# Altium footprint library Package_SO.PcbLib: 333 footprints (part 18 of 21)
Each footprint in its own frame and in the unit in brackets; x right, y up, seen from the top. Pads: shape width x height; smd on the part's side, far side on the other; paste and mask are expansions set on the pad; w line width, h text height; cw(c..) or ccw(c..) is an arc to the next point about the centre after c.
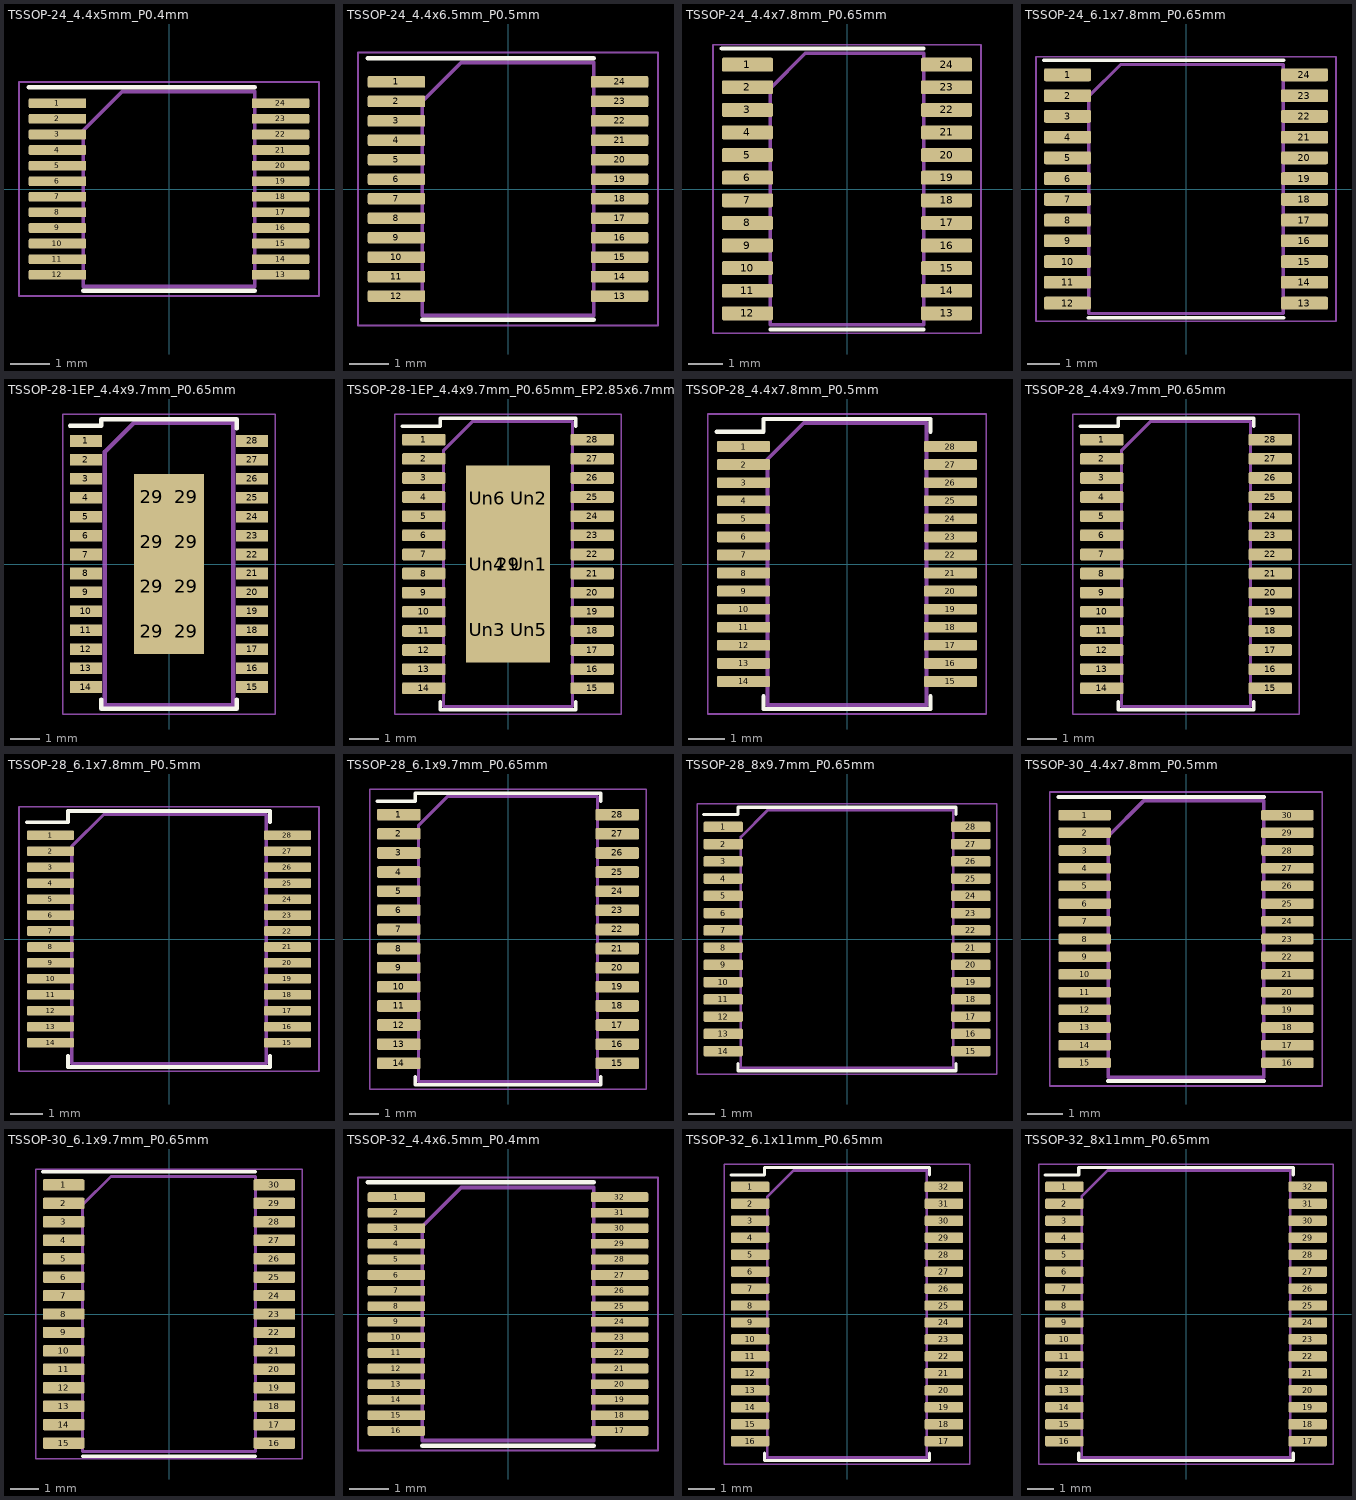
[diagram p17: the footprints below, top view; thin cyan lines are the x and y axes]

## TSSOP-24_4.4x5mm_P0.4mm [mm]
pads (24):
  rrect25% 1.475x0.25 smd: 1(-2.863,2.2) 2(-2.863,1.8) 3(-2.863,1.4) 4(-2.863,1) 5(-2.863,0.6) 6(-2.863,0.2) 7(-2.863,-0.2) 8(-2.863,-0.6) 9(-2.863,-1) 10(-2.863,-1.4) 11(-2.863,-1.8) 12(-2.863,-2.2) 13(2.863,-2.2) 14(2.863,-1.8) 15(2.863,-1.4) 16(2.863,-1) 17(2.863,-0.6) 18(2.863,-0.2) 19(2.863,0.2) 20(2.863,0.6) 21(2.863,1) 22(2.863,1.4) 23(2.863,1.8) 24(2.863,2.2)
F.SilkS:
  lines w0.12: -3.6,2.61 0,2.61 2.2,2.61 ; -2.2,-2.61 0,-2.61 2.2,-2.61
F.CrtYd:
  lines w0.05: -3.85,-2.75 -3.85,2.75 3.85,2.75 3.85,-2.75 -3.85,-2.75
F.Fab:
  lines w0.1: -2.2,-2.5 2.2,-2.5 2.2,2.5 -1.2,2.5 -2.2,1.5 -2.2,-2.5
  text "'.Designator'" at -4.047,-0.84 h1

## TSSOP-24_4.4x6.5mm_P0.5mm [mm]
pads (24):
  rrect25% 1.475x0.3 smd: 1(-2.863,2.75) 2(-2.863,2.25) 3(-2.863,1.75) 4(-2.863,1.25) 5(-2.863,0.75) 6(-2.863,0.25) 7(-2.863,-0.25) 8(-2.863,-0.75) 9(-2.863,-1.25) 10(-2.863,-1.75) 11(-2.863,-2.25) 12(-2.863,-2.75) 13(2.863,-2.75) 14(2.863,-2.25) 15(2.863,-1.75) 16(2.863,-1.25) 17(2.863,-0.75) 18(2.863,-0.25) 19(2.863,0.25) 20(2.863,0.75) 21(2.863,1.25) 22(2.863,1.75) 23(2.863,2.25) 24(2.863,2.75)
F.SilkS:
  lines w0.12: -3.6,3.36 0,3.36 2.2,3.36 ; -2.2,-3.36 0,-3.36 2.2,-3.36
F.CrtYd:
  lines w0.05: -3.85,-3.5 3.85,-3.5 3.85,3.5 -3.85,3.5 -3.85,-3.5
F.Fab:
  lines w0.1: -2.2,-3.25 2.2,-3.25 2.2,3.25 -1.2,3.25 -2.2,2.25 -2.2,-3.25
  text "'.Designator'" at -4.047,-0.84 h1

## TSSOP-24_4.4x7.8mm_P0.65mm [mm]
pads (24):
  rrect25% 1.475x0.4 smd: 1(-2.863,3.575) 2(-2.863,2.925) 3(-2.863,2.275) 4(-2.863,1.625) 5(-2.863,0.975) 6(-2.863,0.325) 7(-2.863,-0.325) 8(-2.863,-0.975) 9(-2.863,-1.625) 10(-2.863,-2.275) 11(-2.863,-2.925) 12(-2.863,-3.575) 13(2.863,-3.575) 14(2.863,-2.925) 15(2.863,-2.275) 16(2.863,-1.625) 17(2.863,-0.975) 18(2.863,-0.325) 19(2.863,0.325) 20(2.863,0.975) 21(2.863,1.625) 22(2.863,2.275) 23(2.863,2.925) 24(2.863,3.575)
F.SilkS:
  lines w0.12: -3.6,4.035 0,4.035 2.2,4.035 ; -2.2,-4.035 0,-4.035 2.2,-4.035
F.CrtYd:
  lines w0.05: -3.85,-4.15 3.85,-4.15 3.85,4.15 -3.85,4.15 -3.85,-4.15
F.Fab:
  lines w0.1: -2.2,-3.9 -2.2,2.9 -1.2,3.9 2.2,3.9 2.2,-3.9 -2.2,-3.9
  text "'.Designator'" at -4.047,-0.84 h1

## TSSOP-24_6.1x7.8mm_P0.65mm [mm]
pads (24):
  rrect25% 1.475x0.4 smd: 1(-3.712,3.575) 2(-3.712,2.925) 3(-3.712,2.275) 4(-3.712,1.625) 5(-3.712,0.975) 6(-3.712,0.325) 7(-3.712,-0.325) 8(-3.712,-0.975) 9(-3.712,-1.625) 10(-3.712,-2.275) 11(-3.712,-2.925) 12(-3.712,-3.575) 13(3.712,-3.575) 14(3.712,-2.925) 15(3.712,-2.275) 16(3.712,-1.625) 17(3.712,-0.975) 18(3.712,-0.325) 19(3.712,0.325) 20(3.712,0.975) 21(3.712,1.625) 22(3.712,2.275) 23(3.712,2.925) 24(3.712,3.575)
F.SilkS:
  lines w0.12: -4.45,4.035 0,4.035 3.05,4.035 ; -3.05,-4.035 0,-4.035 3.05,-4.035
F.CrtYd:
  lines w0.05: -4.7,-4.15 -4.7,4.15 4.7,4.15 4.7,-4.15 -4.7,-4.15
F.Fab:
  lines w0.1: -3.05,-3.9 3.05,-3.9 3.05,3.9 -2.05,3.9 -3.05,2.9 -3.05,-3.9
  text "'.Designator'" at -4.047,-0.84 h1

## TSSOP-28-1EP_4.4x9.7mm_P0.65mm [mm]
pads (36):
  rect 1.1x0.4 smd: 1(-2.85,4.225) 2(-2.85,3.575) 3(-2.85,2.925) 4(-2.85,2.275) 5(-2.85,1.625) 6(-2.85,0.975) 7(-2.85,0.325) 8(-2.85,-0.325) 9(-2.85,-0.975) 10(-2.85,-1.625) 11(-2.85,-2.275) 12(-2.85,-2.925) 13(-2.85,-3.575) 14(-2.85,-4.225) 15(2.85,-4.225) 16(2.85,-3.575) 17(2.85,-2.925) 18(2.85,-2.275) 19(2.85,-1.625) 20(2.85,-0.975) 21(2.85,-0.325) 22(2.85,0.325) 23(2.85,0.975) 24(2.85,1.625) 25(2.85,2.275) 26(2.85,2.925) 27(2.85,3.575) 28(2.85,4.225)
  rect 1.2x1.542 smd: 29(-0.6,-2.314) 29(-0.6,-0.771) 29(-0.6,0.771) 29(-0.6,2.314) 29(0.6,-2.314) 29(0.6,-0.771) 29(0.6,0.771) 29(0.6,2.314)
F.SilkS:
  lines w0.15: -3.4,4.75 -2.325,4.75 -2.325,4.975 2.325,4.975 2.325,4.65 ; -2.325,-4.65 -2.325,-4.975 2.325,-4.975 2.325,-4.65
F.CrtYd:
  lines w0.05: -3.65,-5.15 -3.65,5.15 3.65,5.15 3.65,-5.15 -3.65,-5.15
F.Fab:
  lines w0.15: -2.2,-4.85 -2.2,3.85 -1.2,4.85 2.2,4.85 2.2,-4.85 -2.2,-4.85
  text "'.Designator'" at -3.267,-0.702 h0.8

## TSSOP-28-1EP_4.4x9.7mm_P0.65mm_EP2.85x6.7mm [mm]
pads (35):
  rrect25% 1.475x0.4 smd: 1(-2.863,4.225) 2(-2.863,3.575) 3(-2.863,2.925) 4(-2.863,2.275) 5(-2.863,1.625) 6(-2.863,0.975) 7(-2.863,0.325) 8(-2.863,-0.325) 9(-2.863,-0.975) 10(-2.863,-1.625) 11(-2.863,-2.275) 12(-2.863,-2.925) 13(-2.863,-3.575) 14(-2.863,-4.225) 15(2.863,-4.225) 16(2.863,-3.575) 17(2.863,-2.925) 18(2.863,-2.275) 19(2.863,-1.625) 20(2.863,-0.975) 21(2.863,-0.325) 22(2.863,0.325) 23(2.863,0.975) 24(2.863,1.625) 25(2.863,2.275) 26(2.863,2.925) 27(2.863,3.575) 28(2.863,4.225)
  rect 2.85x6.7 smd: 29(0,0)
  rrect22% 1.15x1.8 on Top Paste: Un1(0.71,0) Un2(0.71,2.23) Un3(-0.71,-2.23) Un4(-0.71,0) Un5(0.71,-2.23) Un6(-0.71,2.23)
F.SilkS:
  lines w0.12: -3.6,4.685 -2.31,4.685 -2.31,4.96 0,4.96 2.31,4.96 2.31,4.685 ; -2.31,-4.685 -2.31,-4.96 0,-4.96 2.31,-4.96 2.31,-4.685
F.CrtYd:
  lines w0.05: -3.85,-5.1 3.85,-5.1 3.85,5.1 -3.85,5.1 -3.85,-5.1
F.Fab:
  lines w0.1: -2.2,-4.85 -2.2,3.85 -1.2,4.85 2.2,4.85 2.2,-4.85 -2.2,-4.85
  text "'.Designator'" at -4.047,-0.84 h1

## TSSOP-28_4.4x7.8mm_P0.5mm [mm]
pads (28):
  rrect25% 1.475x0.3 smd: 1(-2.863,3.25) 2(-2.863,2.75) 3(-2.863,2.25) 4(-2.863,1.75) 5(-2.863,1.25) 6(-2.863,0.75) 7(-2.863,0.25) 8(-2.863,-0.25) 9(-2.863,-0.75) 10(-2.863,-1.25) 11(-2.863,-1.75) 12(-2.863,-2.25) 13(-2.863,-2.75) 14(-2.863,-3.25) 15(2.863,-3.25) 16(2.863,-2.75) 17(2.863,-2.25) 18(2.863,-1.75) 19(2.863,-1.25) 20(2.863,-0.75) 21(2.863,-0.25) 22(2.863,0.25) 23(2.863,0.75) 24(2.863,1.25) 25(2.863,1.75) 26(2.863,2.25) 27(2.863,2.75) 28(2.863,3.25)
F.SilkS:
  lines w0.12: -3.6,3.66 -2.31,3.66 -2.31,4.01 0,4.01 2.31,4.01 2.31,3.66 ; -2.31,-3.66 -2.31,-4.01 0,-4.01 2.31,-4.01 2.31,-3.66
F.CrtYd:
  lines w0.05: -3.85,-4.15 3.85,-4.15 3.85,4.15 -3.85,4.15 -3.85,-4.15
F.Fab:
  lines w0.1: -2.2,-3.9 -2.2,2.9 -1.2,3.9 2.2,3.9 2.2,-3.9 -2.2,-3.9
  text "'.Designator'" at -4.047,-0.84 h1

## TSSOP-28_4.4x9.7mm_P0.65mm [mm]
pads (28):
  rrect25% 1.475x0.4 smd: 1(-2.863,4.225) 2(-2.863,3.575) 3(-2.863,2.925) 4(-2.863,2.275) 5(-2.863,1.625) 6(-2.863,0.975) 7(-2.863,0.325) 8(-2.863,-0.325) 9(-2.863,-0.975) 10(-2.863,-1.625) 11(-2.863,-2.275) 12(-2.863,-2.925) 13(-2.863,-3.575) 14(-2.863,-4.225) 15(2.863,-4.225) 16(2.863,-3.575) 17(2.863,-2.925) 18(2.863,-2.275) 19(2.863,-1.625) 20(2.863,-0.975) 21(2.863,-0.325) 22(2.863,0.325) 23(2.863,0.975) 24(2.863,1.625) 25(2.863,2.275) 26(2.863,2.925) 27(2.863,3.575) 28(2.863,4.225)
F.SilkS:
  lines w0.12: -3.6,4.685 -2.31,4.685 -2.31,4.96 0,4.96 2.31,4.96 2.31,4.685 ; -2.31,-4.685 -2.31,-4.96 0,-4.96 2.31,-4.96 2.31,-4.685
F.CrtYd:
  lines w0.05: -3.85,-5.1 3.85,-5.1 3.85,5.1 -3.85,5.1 -3.85,-5.1
F.Fab:
  lines w0.1: -2.2,-4.85 2.2,-4.85 2.2,4.85 -1.2,4.85 -2.2,3.85 -2.2,-4.85
  text "'.Designator'" at -4.047,-0.84 h1

## TSSOP-28_6.1x7.8mm_P0.5mm [mm]
pads (28):
  rrect25% 1.475x0.3 smd: 1(-3.712,3.25) 2(-3.712,2.75) 3(-3.712,2.25) 4(-3.712,1.75) 5(-3.712,1.25) 6(-3.712,0.75) 7(-3.712,0.25) 8(-3.712,-0.25) 9(-3.712,-0.75) 10(-3.712,-1.25) 11(-3.712,-1.75) 12(-3.712,-2.25) 13(-3.712,-2.75) 14(-3.712,-3.25) 15(3.712,-3.25) 16(3.712,-2.75) 17(3.712,-2.25) 18(3.712,-1.75) 19(3.712,-1.25) 20(3.712,-0.75) 21(3.712,-0.25) 22(3.712,0.25) 23(3.712,0.75) 24(3.712,1.25) 25(3.712,1.75) 26(3.712,2.25) 27(3.712,2.75) 28(3.712,3.25)
F.SilkS:
  lines w0.12: -4.45,3.66 -3.16,3.66 -3.16,4.01 0,4.01 3.16,4.01 3.16,3.66 ; -3.16,-3.66 -3.16,-4.01 0,-4.01 3.16,-4.01 3.16,-3.66
F.CrtYd:
  lines w0.05: -4.7,-4.15 4.7,-4.15 4.7,4.15 -4.7,4.15 -4.7,-4.15
F.Fab:
  lines w0.1: -3.05,-3.9 3.05,-3.9 3.05,3.9 -2.05,3.9 -3.05,2.9 -3.05,-3.9
  text "'.Designator'" at -4.047,-0.84 h1

## TSSOP-28_6.1x9.7mm_P0.65mm [mm]
pads (28):
  rrect25% 1.475x0.4 smd: 1(-3.712,4.225) 2(-3.712,3.575) 3(-3.712,2.925) 4(-3.712,2.275) 5(-3.712,1.625) 6(-3.712,0.975) 7(-3.712,0.325) 8(-3.712,-0.325) 9(-3.712,-0.975) 10(-3.712,-1.625) 11(-3.712,-2.275) 12(-3.712,-2.925) 13(-3.712,-3.575) 14(-3.712,-4.225) 15(3.712,-4.225) 16(3.712,-3.575) 17(3.712,-2.925) 18(3.712,-2.275) 19(3.712,-1.625) 20(3.712,-0.975) 21(3.712,-0.325) 22(3.712,0.325) 23(3.712,0.975) 24(3.712,1.625) 25(3.712,2.275) 26(3.712,2.925) 27(3.712,3.575) 28(3.712,4.225)
F.SilkS:
  lines w0.12: -4.45,4.685 -3.16,4.685 -3.16,4.96 0,4.96 3.16,4.96 3.16,4.685 ; -3.16,-4.685 -3.16,-4.96 0,-4.96 3.16,-4.96 3.16,-4.685
F.CrtYd:
  lines w0.05: -4.7,-5.1 -4.7,5.1 4.7,5.1 4.7,-5.1 -4.7,-5.1
F.Fab:
  lines w0.1: -3.05,-4.85 -3.05,3.85 -2.05,4.85 3.05,4.85 3.05,-4.85 -3.05,-4.85
  text "'.Designator'" at -4.047,-0.84 h1

## TSSOP-28_8x9.7mm_P0.65mm [mm]
pads (28):
  rrect25% 1.475x0.4 smd: 1(-4.663,4.225) 2(-4.663,3.575) 3(-4.663,2.925) 4(-4.663,2.275) 5(-4.663,1.625) 6(-4.663,0.975) 7(-4.663,0.325) 8(-4.663,-0.325) 9(-4.663,-0.975) 10(-4.663,-1.625) 11(-4.663,-2.275) 12(-4.663,-2.925) 13(-4.663,-3.575) 14(-4.663,-4.225) 15(4.663,-4.225) 16(4.663,-3.575) 17(4.663,-2.925) 18(4.663,-2.275) 19(4.663,-1.625) 20(4.663,-0.975) 21(4.663,-0.325) 22(4.663,0.325) 23(4.663,0.975) 24(4.663,1.625) 25(4.663,2.275) 26(4.663,2.925) 27(4.663,3.575) 28(4.663,4.225)
F.SilkS:
  lines w0.12: -5.4,4.685 -4.11,4.685 -4.11,4.96 0,4.96 4.11,4.96 4.11,4.685 ; -4.11,-4.685 -4.11,-4.96 0,-4.96 4.11,-4.96 4.11,-4.685
F.CrtYd:
  lines w0.05: -5.65,-5.1 -5.65,5.1 5.65,5.1 5.65,-5.1 -5.65,-5.1
F.Fab:
  lines w0.1: -4,-4.85 4,-4.85 4,4.85 -3,4.85 -4,3.85 -4,-4.85
  text "'.Designator'" at -4.047,-0.84 h1

## TSSOP-30_4.4x7.8mm_P0.5mm [mm]
pads (30):
  rrect25% 1.475x0.3 smd: 1(-2.863,3.5) 2(-2.863,3) 3(-2.863,2.5) 4(-2.863,2) 5(-2.863,1.5) 6(-2.863,1) 7(-2.863,0.5) 8(-2.863,0) 9(-2.863,-0.5) 10(-2.863,-1) 11(-2.863,-1.5) 12(-2.863,-2) 13(-2.863,-2.5) 14(-2.863,-3) 15(-2.863,-3.5) 16(2.863,-3.5) 17(2.863,-3) 18(2.863,-2.5) 19(2.863,-2) 20(2.863,-1.5) 21(2.863,-1) 22(2.863,-0.5) 23(2.863,0) 24(2.863,0.5) 25(2.863,1) 26(2.863,1.5) 27(2.863,2) 28(2.863,2.5) 29(2.863,3) 30(2.863,3.5)
F.SilkS:
  lines w0.12: -3.6,4.01 0,4.01 2.2,4.01 ; -2.2,-4.01 0,-4.01 2.2,-4.01
F.CrtYd:
  lines w0.05: -3.85,-4.15 3.85,-4.15 3.85,4.15 -3.85,4.15 -3.85,-4.15
F.Fab:
  lines w0.1: -2.2,-3.9 -2.2,2.9 -1.2,3.9 2.2,3.9 2.2,-3.9 -2.2,-3.9
  text "'.Designator'" at -4.047,-0.84 h1

## TSSOP-30_6.1x9.7mm_P0.65mm [mm]
pads (30):
  rrect25% 1.475x0.4 smd: 1(-3.712,4.55) 2(-3.712,3.9) 3(-3.712,3.25) 4(-3.712,2.6) 5(-3.712,1.95) 6(-3.712,1.3) 7(-3.712,0.65) 8(-3.712,0) 9(-3.712,-0.65) 10(-3.712,-1.3) 11(-3.712,-1.95) 12(-3.712,-2.6) 13(-3.712,-3.25) 14(-3.712,-3.9) 15(-3.712,-4.55) 16(3.712,-4.55) 17(3.712,-3.9) 18(3.712,-3.25) 19(3.712,-2.6) 20(3.712,-1.95) 21(3.712,-1.3) 22(3.712,-0.65) 23(3.712,0) 24(3.712,0.65) 25(3.712,1.3) 26(3.712,1.95) 27(3.712,2.6) 28(3.712,3.25) 29(3.712,3.9) 30(3.712,4.55)
F.SilkS:
  lines w0.12: -4.45,5.01 0,5.01 3.05,5.01 ; -3.05,-5.01 0,-5.01 3.05,-5.01
F.CrtYd:
  lines w0.05: -4.7,-5.1 -4.7,5.1 4.7,5.1 4.7,-5.1 -4.7,-5.1
F.Fab:
  lines w0.1: -3.05,-4.85 -3.05,3.85 -2.05,4.85 3.05,4.85 3.05,-4.85 -3.05,-4.85
  text "'.Designator'" at -4.047,-0.84 h1

## TSSOP-32_4.4x6.5mm_P0.4mm [mm]
pads (32):
  rrect25% 1.475x0.25 smd: 1(-2.863,3) 2(-2.863,2.6) 3(-2.863,2.2) 4(-2.863,1.8) 5(-2.863,1.4) 6(-2.863,1) 7(-2.863,0.6) 8(-2.863,0.2) 9(-2.863,-0.2) 10(-2.863,-0.6) 11(-2.863,-1) 12(-2.863,-1.4) 13(-2.863,-1.8) 14(-2.863,-2.2) 15(-2.863,-2.6) 16(-2.863,-3) 17(2.863,-3) 18(2.863,-2.6) 19(2.863,-2.2) 20(2.863,-1.8) 21(2.863,-1.4) 22(2.863,-1) 23(2.863,-0.6) 24(2.863,-0.2) 25(2.863,0.2) 26(2.863,0.6) 27(2.863,1) 28(2.863,1.4) 29(2.863,1.8) 30(2.863,2.2) 31(2.863,2.6) 32(2.863,3)
F.SilkS:
  lines w0.12: -3.6,3.385 0,3.385 2.2,3.385 ; -2.2,-3.385 0,-3.385 2.2,-3.385
F.CrtYd:
  lines w0.05: -3.85,-3.5 -3.85,3.5 3.85,3.5 3.85,-3.5 -3.85,-3.5
F.Fab:
  lines w0.1: -2.2,-3.25 -2.2,2.25 -1.2,3.25 2.2,3.25 2.2,-3.25 -2.2,-3.25
  text "'.Designator'" at -4.047,-0.84 h1

## TSSOP-32_6.1x11mm_P0.65mm [mm]
pads (32):
  rrect25% 1.475x0.4 smd: 1(-3.712,4.875) 2(-3.712,4.225) 3(-3.712,3.575) 4(-3.712,2.925) 5(-3.712,2.275) 6(-3.712,1.625) 7(-3.712,0.975) 8(-3.712,0.325) 9(-3.712,-0.325) 10(-3.712,-0.975) 11(-3.712,-1.625) 12(-3.712,-2.275) 13(-3.712,-2.925) 14(-3.712,-3.575) 15(-3.712,-4.225) 16(-3.712,-4.875) 17(3.712,-4.875) 18(3.712,-4.225) 19(3.712,-3.575) 20(3.712,-2.925) 21(3.712,-2.275) 22(3.712,-1.625) 23(3.712,-0.975) 24(3.712,-0.325) 25(3.712,0.325) 26(3.712,0.975) 27(3.712,1.625) 28(3.712,2.275) 29(3.712,2.925) 30(3.712,3.575) 31(3.712,4.225) 32(3.712,4.875)
F.SilkS:
  lines w0.12: -4.45,5.335 -3.16,5.335 -3.16,5.61 0,5.61 3.16,5.61 3.16,5.335 ; -3.16,-5.335 -3.16,-5.61 0,-5.61 3.16,-5.61 3.16,-5.335
F.CrtYd:
  lines w0.05: -4.7,-5.75 -4.7,5.75 4.7,5.75 4.7,-5.75 -4.7,-5.75
F.Fab:
  lines w0.1: -3.05,-5.5 3.05,-5.5 3.05,5.5 -2.05,5.5 -3.05,4.5 -3.05,-5.5
  text "'.Designator'" at -4.047,-0.84 h1

## TSSOP-32_8x11mm_P0.65mm [mm]
pads (32):
  rrect25% 1.475x0.4 smd: 1(-4.663,4.875) 2(-4.663,4.225) 3(-4.663,3.575) 4(-4.663,2.925) 5(-4.663,2.275) 6(-4.663,1.625) 7(-4.663,0.975) 8(-4.663,0.325) 9(-4.663,-0.325) 10(-4.663,-0.975) 11(-4.663,-1.625) 12(-4.663,-2.275) 13(-4.663,-2.925) 14(-4.663,-3.575) 15(-4.663,-4.225) 16(-4.663,-4.875) 17(4.663,-4.875) 18(4.663,-4.225) 19(4.663,-3.575) 20(4.663,-2.925) 21(4.663,-2.275) 22(4.663,-1.625) 23(4.663,-0.975) 24(4.663,-0.325) 25(4.663,0.325) 26(4.663,0.975) 27(4.663,1.625) 28(4.663,2.275) 29(4.663,2.925) 30(4.663,3.575) 31(4.663,4.225) 32(4.663,4.875)
F.SilkS:
  lines w0.12: -5.4,5.335 -4.11,5.335 -4.11,5.61 0,5.61 4.11,5.61 4.11,5.335 ; -4.11,-5.335 -4.11,-5.61 0,-5.61 4.11,-5.61 4.11,-5.335
F.CrtYd:
  lines w0.05: -5.65,-5.75 -5.65,5.75 5.65,5.75 5.65,-5.75 -5.65,-5.75
F.Fab:
  lines w0.1: -4,-5.5 -4,4.5 -3,5.5 4,5.5 4,-5.5 -4,-5.5
  text "'.Designator'" at -4.047,-0.84 h1